# Altium footprint library 15.Switches&Relay.PcbLib: 33 footprints (part 3 of 3)
Each footprint in its own frame and in the unit in brackets; x right, y up, seen from the top. Pads: shape width x height; smd on the part's side, far side on the other; paste and mask are expansions set on the pad; w line width, h text height; cw(c..) or ccw(c..) is an arc to the next point about the centre after c.
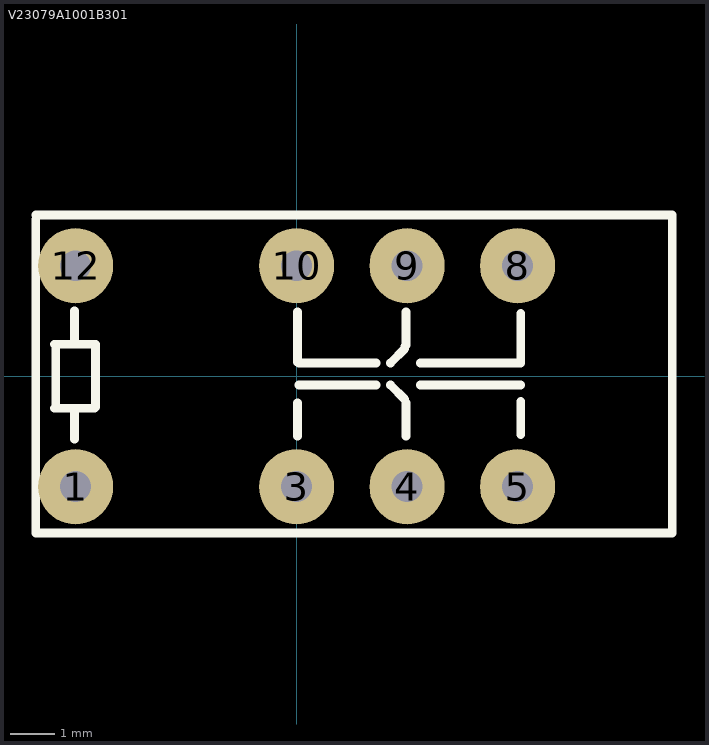
[diagram p2: the footprint, top view; thin cyan lines are the x and y axes]

## V23079A1001B301 [mm]
pads (8):
  round 1.7 hole 0.7: 1(-5,-2.5) 3(0,-2.5) 4(2.5,-2.5) 5(5,-2.5) 8(5,2.5) 9(2.5,2.5) 10(0,2.5) 12(-5,2.5)
Top Overlay:
  lines w0.2: -5.9,3.55 -5.9,-3.55 ; -5.9,3.65 8.5,3.65 8.5,-3.55 ; -5.475,0.725 -4.55,0.725 -4.55,-0.7 -4.575,-0.725 -5.475,-0.725 -5.45,-0.7 -5.45,0.725 ; -5.025,-1.425 -5.025,-0.8 ; -5.025,0.8 -5.025,1.475 ; 0.025,-1.35 0.025,-0.6 ; 0.025,1.45 0.025,0.7 0.025,0.325 0.05,0.3 1.8,0.3 ; 0.05,-0.2 1.8,-0.2 ; 2.125,-0.2 2.45,-0.525 ; 2.125,0.3 2.45,0.625 2.45,0.675 ; 2.475,-1.35 2.475,-0.6 ; 2.475,0.7 2.475,1.45 ; 2.8,-0.2 5.075,-0.2 ; 2.8,0.3 5.075,0.3 5.075,0.675 5.075,1.425 ; 5.075,-1.325 5.075,-0.575 ; -5.9,-3.55 8.5,-3.55 ; -5.9,-3.55 8.5,-3.55
3D body "08h5835_v23079c1101b301.stp": height 9.8, standoff -3.25, extent -5.875,-3.65 8.625,3.55